# Altium schematic symbol library AliPadash.SchLib: 1186 symbols (part 3 of 6) (continued)
## LM7908 (continued)
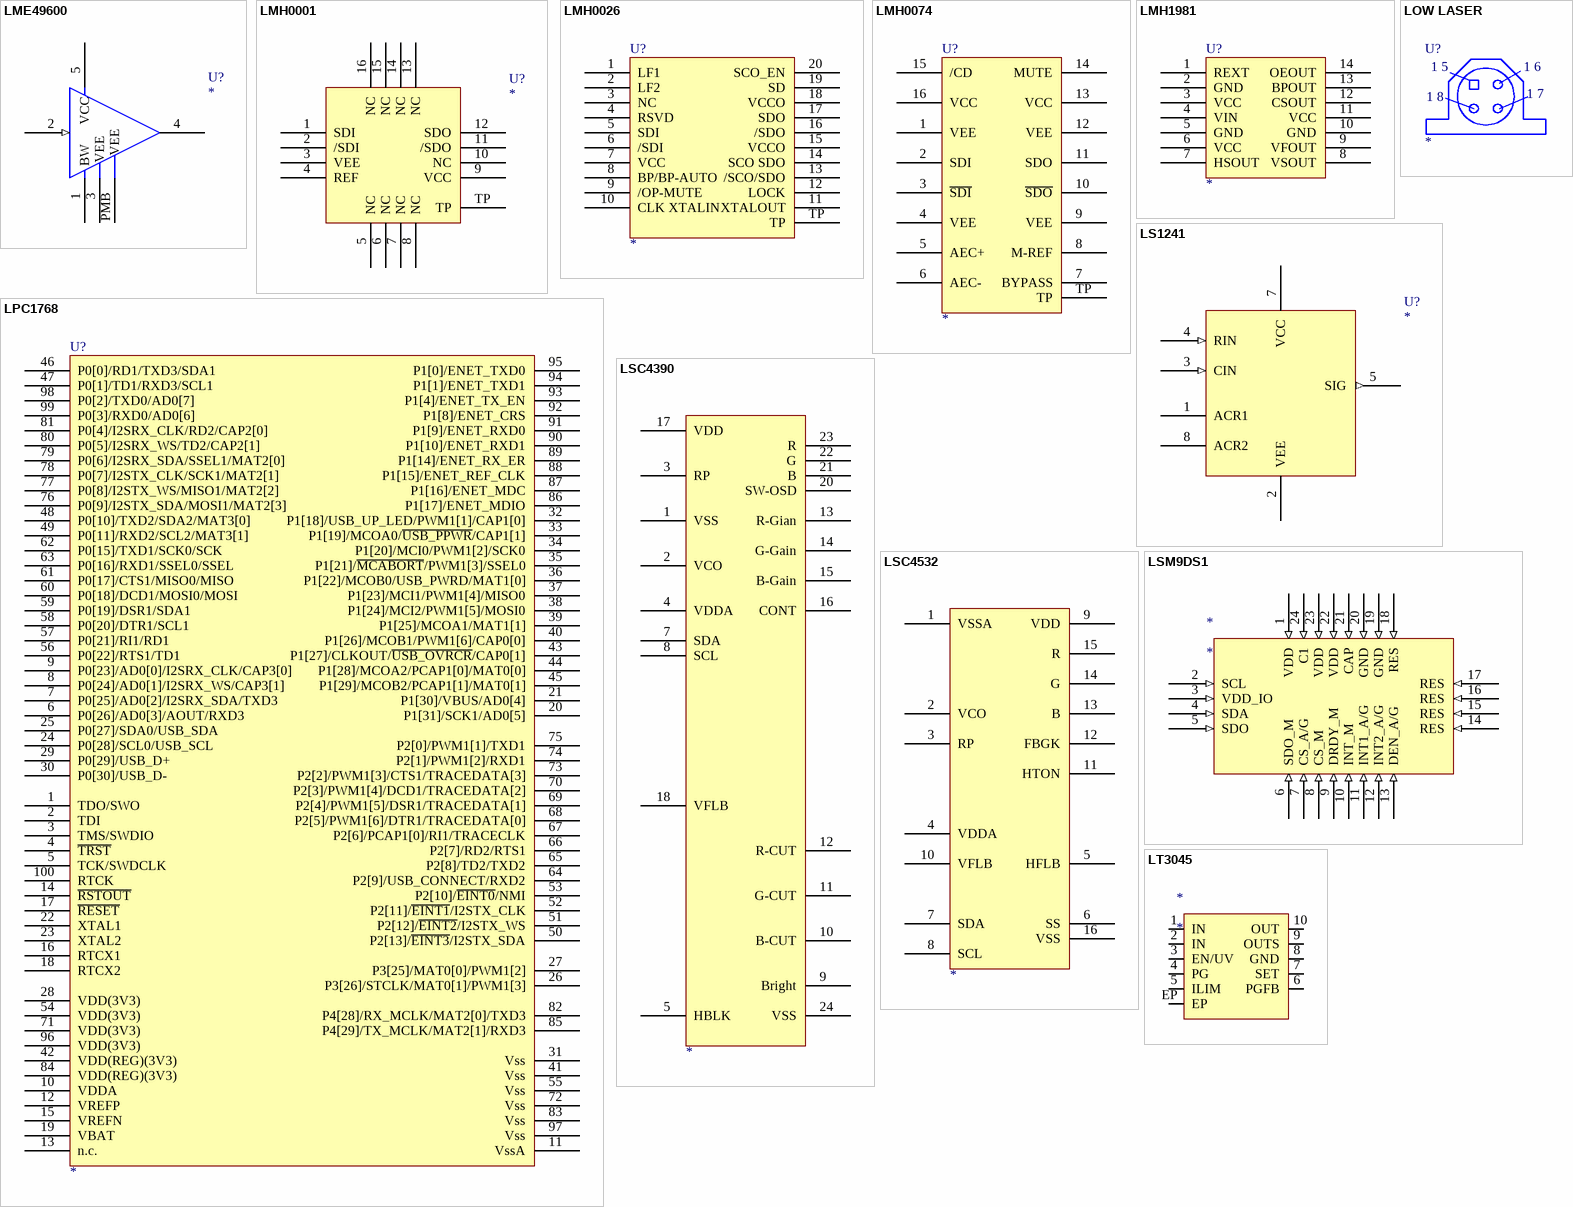
[diagram p39: symbols LME49600 to LT3045]

## LME49600
designator U?
footprint TS5B
pins: 1  BW, 2 (in), 3   VEE, 4, 5 VCC, PMB     VEE

## LMH0001
designator U?
footprint QFN16
pins: 1 SDI, 2 /SDI, 3 VEE, 4 REF, 5 NC, 6 NC, 7 NC, 8 NC, 9 VCC, 10 NC, 11 /SDO, 12 SDO, 13 NC, 14 NC, 15 NC, 16 NC, TP

## LMH0026
designator U?
footprint TSSOP20
pins: 1 LF1, 2 LF2, 3 NC, 4 RSVD, 5 SDI, 6 /SDI, 7 VCC, 8 BP/BP-AUTO, 9 /OP-MUTE, 10 CLK XTALIN, 11 XTALOUT, 12 LOCK, 13 /SCO/SDO, 14 SCO SDO, 15 VCCO, 16 /SDO, 17 SDO, 18 VCCO, 19 SD, 20 SCO_EN, TP

## LMH0074
designator U?
footprint QFN16
pins: 1 VEE, 2 SDI, 3 ~{SDI}, 4 VEE, 5 AEC+, 6 AEC-, 7 BYPASS, 8 M-REF, 9 VEE, 10 ~{SDO}, 11 SDO, 12 VEE, 13 VCC, 14 MUTE, 15 /CD, 16 VCC, TP

## LMH1981
designator U?
footprint TSS-14
pins: 1 REXT, 2 GND, 3 VCC, 4 VIN, 5 GND, 6 VCC, 7 HSOUT, 8 VSOUT, 9 VFOUT, 10 GND, 11 VCC, 12 CSOUT, 13 BPOUT, 14 OEOUT

## LOW LASER
designator U?
text: 1 5; 1 6; 1 8; 1 7

## LPC1768
designator U?
footprint LQFP100
pins: 1 TDO/SWO, 2 TDI, 3 TMS/SWDIO, 4 ~{TRST}, 5 TCK/SWDCLK, 6 P0[26]/AD0[3]/AOUT/RXD3, 7 P0[25]/AD0[2]/I2SRX_SDA/TXD3, 8 P0[24]/AD0[1]/I2SRX_WS/CAP3[1], 9 P0[23]/AD0[0]/I2SRX_CLK/CAP3[0], 10 VDDA, 11 VssA, 12 VREFP, 13 n.c., 14 ~{RSTOUT}, 15 VREFN, 16 RTCX1, 17 ~{RESET}, 18 RTCX2, 19 VBAT, 20 P1[31]/SCK1/AD0[5], 21 P1[30]/VBUS/AD0[4], 22 XTAL1, 23 XTAL2, 24 P0[28]/SCL0/USB_SCL, 25 P0[27]/SDA0/USB_SDA, 26 P3[26]/STCLK/MAT0[1]/PWM1[3], 27 P3[25]/MAT0[0]/PWM1[2], 28 VDD(3V3), 29 P0[29]/USB_D+, 30 P0[30]/USB_D-, 31 Vss, 32 P1[18]/USB_UP_LED/PWM1[1]/CAP1[0], 33 P1[19]/MCOA0/~{USB_PPWR}/CAP1[1], 34 P1[20]/MCI0/PWM1[2]/SCK0, 35 P1[21]/~{MCABORT}/PWM1[3]/SSEL0, 36 P1[22]/MCOB0/USB_PWRD/MAT1[0], 37 P1[23]/MCI1/PWM1[4]/MISO0, 38 P1[24]/MCI2/PWM1[5]/MOSI0, 39 P1[25]/MCOA1/MAT1[1], 40 P1[26]/MCOB1/PWM1[6]/CAP0[0], 41 Vss, 42 VDD(REG)(3V3), 43 P1[27]/CLKOUT/~{USB_OVRCR}/CAP0[1], 44 P1[28]/MCOA2/PCAP1[0]/MAT0[0], 45 P1[29]/MCOB2/PCAP1[1]/MAT0[1], 46 P0[0]/RD1/TXD3/SDA1, 47 P0[1]/TD1/RXD3/SCL1, 48 P0[10]/TXD2/SDA2/MAT3[0], 49 P0[11]/RXD2/SCL2/MAT3[1], 50 P2[13]/~{EINT3}/I2STX_SDA, 51 P2[12]/~{EINT2}/I2STX_WS, 52 P2[11]/~{EINT1}/I2STX_CLK, 53 P2[10]/~{EINT0}/NMI, 54 VDD(3V3), 55 Vss, 56 P0[22]/RTS1/TD1, 57 P0[21]/RI1/RD1, 58 P0[20]/DTR1/SCL1, 59 P0[19]/DSR1/SDA1, 60 P0[18]/DCD1/MOSI0/MOSI, 61 P0[17]/CTS1/MISO0/MISO, 62 P0[15]/TXD1/SCK0/SCK, 63 P0[16]/RXD1/SSEL0/SSEL, 64 P2[9]/USB_CONNECT/RXD2, 65 P2[8]/TD2/TXD2, 66 P2[7]/RD2/RTS1, 67 P2[6]/PCAP1[0]/RI1/TRACECLK, 68 P2[5]/PWM1[6]/DTR1/TRACEDATA[0], 69 P2[4]/PWM1[5]/DSR1/TRACEDATA[1], 70 P2[3]/PWM1[4]/DCD1/TRACEDATA[2], 71 VDD(3V3), 72 Vss, 73 P2[2]/PWM1[3]/CTS1/TRACEDATA[3], 74 P2[1]/PWM1[2]/RXD1, 75 P2[0]/PWM1[1]/TXD1, 76 P0[9]/I2STX_SDA/MOSI1/MAT2[3], 77 P0[8]/I2STX_WS/MISO1/MAT2[2], 78 P0[7]/I2STX_CLK/SCK1/MAT2[1], 79 P0[6]/I2SRX_SDA/SSEL1/MAT2[0], 80 P0[5]/I2SRX_WS/TD2/CAP2[1], 81 P0[4]/I2SRX_CLK/RD2/CAP2[0], 82 P4[28]/RX_MCLK/MAT2[0]/TXD3, 83 Vss, 84 VDD(REG)(3V3), 85 P4[29]/TX_MCLK/MAT2[1]/RXD3, 86 P1[17]/ENET_MDIO, 87 P1[16]/ENET_MDC, 88 P1[15]/ENET_REF_CLK, 89 P1[14]/ENET_RX_ER, 90 P1[10]/ENET_RXD1, 91 P1[9]/ENET_RXD0, 92 P1[8]/ENET_CRS, 93 P1[4]/ENET_TX_EN, 94 P1[1]/ENET_TXD1, 95 P1[0]/ENET_TXD0, 96 VDD(3V3), 97 Vss, 98 P0[2]/TXD0/AD0[7], 99 P0[3]/RXD0/AD0[6], 100 RTCK

## LS1241
designator U?
pins: 1 ACR1, 2 VEE, 3 CIN (in), 4 RIN (in), 5 SIG (out), 7 VCC, 8 ACR2

## LSC4390
designator ?
pins: 1 VSS, 2 VCO, 3 RP, 4 VDDA, 5 HBLK, 7 SDA, 8 SCL, 9 Bright, 10 B-CUT, 11 G-CUT, 12 R-CUT, 13 R-Gian, 14 G-Gain, 15 B-Gain, 16 CONT, 17 VDD, 18 VFLB, 20 SW-OSD, 21 B, 22 G, 23 R, 24 VSS

## LSC4532
designator ?
pins: 1 VSSA, 2 VCO, 3 RP, 4 VDDA, 5 HFLB, 6 SS, 7 SDA, 8 SCL, 9 VDD, 10 VFLB, 11 HTON, 12 FBGK, 13 B, 14 G, 15 R, 16 VSS

## LSM9DS1
designator *
pins: 1 VDD (in), 2 SCL (in), 3 VDD_IO (in), 4 SDA (in), 5 SDO (in), 6 SDO_M (in), 7 CS_A/G (in), 8 CS_M (in), 9 DRDY_M (in), 10 INT_M (in), 11 INT1_A/G (in), 12 INT2_A/G (in), 13 DEN_A/G (in), 14 RES (in), 15 RES (in), 16 RES (in), 17 RES (in), 18 RES (in), 19 GND (in), 20 GND (in), 21 CAP (in), 22 VDD (in), 23 VDD (in), 24 C1 (in)

## LT3045
designator *
footprint DDFN10
pins: 1 IN, 2 IN, 3 EN/UV, 4 PG, 5 ILIM, 6 PGFB, 7 SET, 8 GND, 9 OUTS, 10 OUT, EP

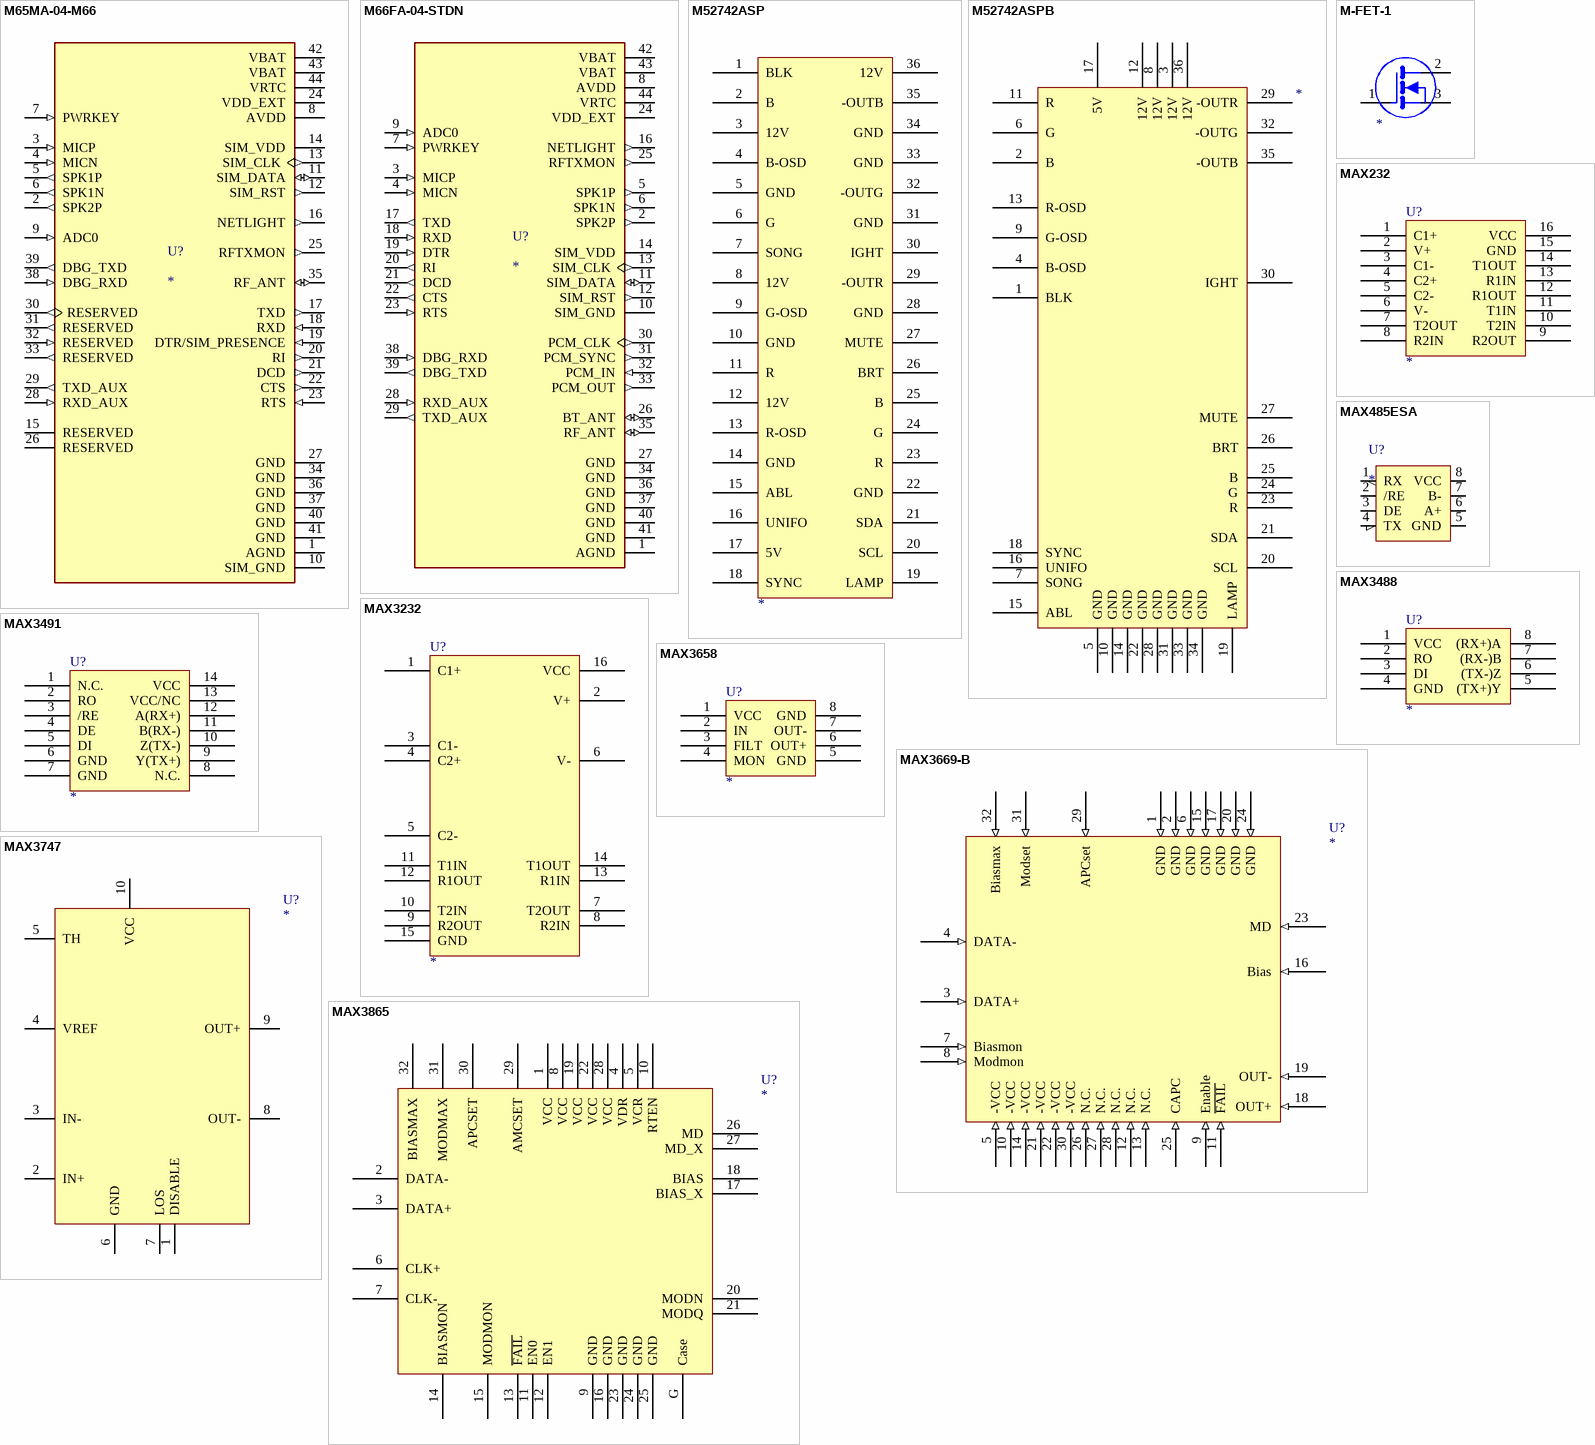
[diagram p40: symbols M65MA-04-M66 to MAX3865]

## M65MA-04-M66
designator U?
Cellular GSM, GPRS Transceiver Module 850MHz, 900MHz, 1.8GHz, 1.9GHz Antenna Not Included Surface Mount; MP: M65MA-04-M66; MF: Quectel; Price: None; SnapEDA_Link: https://www.snapeda.com/parts/M65MA-04-M66/Quectel/view-part/?ref=snap; Check_prices: https://www.snapeda.com/parts/M65MA-04-M66/Quectel/view-part/?ref=eda; Availability: Not in stock; Value: *; Package: None
footprint XCVR_M65MA-04-M66
pins: 1 AGND (power), 2 SPK2P (out), 3 MICP (in), 4 MICN (in), 5 SPK1P (out), 6 SPK1N (out), 7 PWRKEY (in), 8 AVDD (power), 9 ADC0 (in), 10 SIM_GND (power), 11 SIM_DATA (io), 12 SIM_RST (out), 13 SIM_CLK (out), 14 SIM_VDD (power), 15 RESERVED, 16 NETLIGHT (out), 17 TXD (out), 18 RXD (in), 19 DTR/SIM_PRESENCE (in), 20 RI (out), 21 DCD (out), 22 CTS (out), 23 RTS (in), 24 VDD_EXT (power), 25 RFTXMON (out), 26 RESERVED, 27 GND (power), 28 RXD_AUX (in), 29 TXD_AUX (out), 30 RESERVED (out), 31 RESERVED (out), 32 RESERVED (in), 33 RESERVED (out), 34 GND (power), 35 RF_ANT (io), 36 GND (power), 37 GND (power), 38 DBG_RXD (in), 39 DBG_TXD (out), 40 GND (power), 41 GND (power), 42 VBAT (power), 43 VBAT (power), 44 VRTC (power)

## M66FA-04-STDN
designator U?
Bluetooth, Cellular Bluetooth v3.0, GSM, GPRS Transceiver Module 850MHz, 900MHz, 1.8GHz, 1.9GHz Antenna Not Included Surface Mount; MF: Quectel; MP: M66FA04STDN; Value: *; Purchase-URL: https://pricing.snapeda.com/search/part/M66FA04STDN/?ref=eda; Price: None; Package: SMD-52 Quectel; Availability: In Stock; SnapEDA_Link: https://www.snapeda.com/parts/M66FA04STDN/Quectel/view-part/?ref=snap; Check_prices: https://www.snapeda.com/parts/M66FA04STDN/Quectel/view-part/?ref=eda
footprint XCVR_M66FA-04-STDN
pins: 1 AGND (power), 2 SPK2P (out), 3 MICP (in), 4 MICN (in), 5 SPK1P (out), 6 SPK1N (out), 7 PWRKEY (in), 8 AVDD (power), 9 ADC0 (in), 10 SIM_GND (power), 11 SIM_DATA (io), 12 SIM_RST (out), 13 SIM_CLK (out), 14 SIM_VDD (power), 16 NETLIGHT (out), 17 TXD (out), 18 RXD (in), 19 DTR (in), 20 RI (out), 21 DCD (out), 22 CTS (out), 23 RTS (in), 24 VDD_EXT (power), 25 RFTXMON (out), 26 BT_ANT (io), 27 GND (power), 28 RXD_AUX (in), 29 TXD_AUX (out), 30 PCM_CLK (out), 31 PCM_SYNC (out), 32 PCM_IN (in), 33 PCM_OUT (out), 34 GND (power), 35 RF_ANT (io), 36 GND (power), 37 GND (power), 38 DBG_RXD (in), 39 DBG_TXD (out), 40 GND (power), 41 GND (power), 42 VBAT (power), 43 VBAT (power), 44 VRTC (power)

## M52742ASP
designator ?
pins: 1 BLK, 2 B, 3 12V, 4 B-OSD, 5 GND, 6 G, 7 SONG, 8 12V, 9 G-OSD, 10 GND, 11 R, 12 12V, 13 R-OSD, 14 GND, 15 ABL, 16 UNIFO, 17 5V, 18 SYNC, 19 LAMP, 20 SCL, 21 SDA, 22 GND, 23 R, 24 G, 25 B, 26 BRT, 27 MUTE, 28 GND, 29 -OUTR, 30 IGHT, 31 GND, 32 -OUTG, 33 GND, 34 GND, 35 -OUTB, 36 12V

## M52742ASPB
designator ?
pins: 1 BLK, 2 B, 3 12V, 4 B-OSD, 5 GND, 6 G, 7 SONG, 8 12V, 9 G-OSD, 10 GND, 11 R, 12 12V, 13 R-OSD, 14 GND, 15 ABL, 16 UNIFO, 17 5V, 18 SYNC, 19 LAMP, 20 SCL, 21 SDA, 22 GND, 23 R, 24 G, 25 B, 26 BRT, 27 MUTE, 28 GND, 29 -OUTR, 30 IGHT, 31 GND, 32 -OUTG, 33 GND, 34 GND, 35 -OUTB, 36 12V

## M-FET-1
designator ?
pins: 1, 2, 3

## MAX232
designator U?
footprint SOL-16
pins: 1 C1+, 2 V+, 3 C1-, 4 C2+, 5 C2-, 6 V-, 7 T2OUT, 8 R2IN, 9 R2OUT, 10 T2IN, 11 T1IN, 12 R1OUT, 13 R1IN, 14 T1OUT, 15 GND, 16 VCC

## MAX485ESA
designator U?
MFAC: SN65176BDR; JLC: C31302
footprint SO-8
pins: 1 RX, 2 /RE, 3 DE, 4 TX, 5 GND, 6 A+, 7 B-, 8 VCC

## MAX3232
designator U?
footprint SOP16
pins: 1 C1+, 2 V+, 3 C1-, 4 C2+, 5 C2-, 6 V-, 7 T2OUT, 8 R2IN, 9 R2OUT, 10 T2IN, 11 T1IN, 12 R1OUT, 13 R1IN, 14 T1OUT, 15 GND, 16 VCC

## MAX3488
designator U?
footprint SO-8
pins: 1 VCC, 2 RO, 3 DI, 4 GND, 5 (TX+)Y, 6 (TX-)Z, 7 (RX-)B, 8 (RX+)A

## MAX3491
designator U?
footprint SO-14
pins: 1 N.C., 2 RO, 3 /RE, 4 DE, 5 DI, 6 GND, 7 GND, 8 N.C., 9 Y(TX+), 10 Z(TX-), 11 B(RX-), 12 A(RX+), 13 VCC/NC, 14 VCC

## MAX3658
designator U?
footprint T833
pins: 1 VCC, 2 IN, 3 FILT, 4 MON, 5 GND, 6 OUT+, 7 OUT-, 8 GND

## MAX3669-B
designator U?
footprint MAX3669
pins: 1 GND (in), 2 GND (in), 3 DATA+ (in), 4 DATA- (in), 5 -VCC (in), 6 GND (in), 7 Biasmon (in), 8 Modmon (in), 9 Enable (in), 10 -VCC (in), 11 ~{FAIL} (in), 12 N.C. (in), 13 N.C. (in), 14 -VCC (in), 15 GND (in), 16 Bias (in), 17 GND (in), 18 OUT+ (in), 19 OUT- (in), 20 GND (in), 21 -VCC (in), 22 -VCC (in), 23 MD (in), 24 GND (in), 25 CAPC (in), 26 N.C. (in), 27 N.C. (in), 28 N.C. (in), 29 APCset (in), 30 -VCC (in), 31 Modset (in), 32 Biasmax (in)

## MAX3747
designator U?
footprint 10UMAX
pins: 1 DISABLE, 2 IN+, 3 IN-, 4 VREF, 5 TH, 6 GND, 7 LOS, 8 OUT-, 9 OUT+, 10 VCC

## MAX3865
designator U?
footprint ADN8830 - A
pins: 1 VCC, 2 DATA-, 3 DATA+, 4 VDR, 5 VCR, 6 CLK+, 7 CLK-, 8 VCC, 9 GND, 10 RTEN, 11 EN0, 12 EN1, 13 ~{FAIL}, 14 BIASMON, 15 MODMON, 16 GND, 17 BIAS_X, 18 BIAS, 19 VCC, 20 MODN, 21 MODQ, 22 VCC, 23 GND, 24 GND, 25 GND, 26 MD, 27 MD_X, 28 VCC, 29 AMCSET, 30 APCSET, 31 MODMAX, 32 BIASMAX, G Case

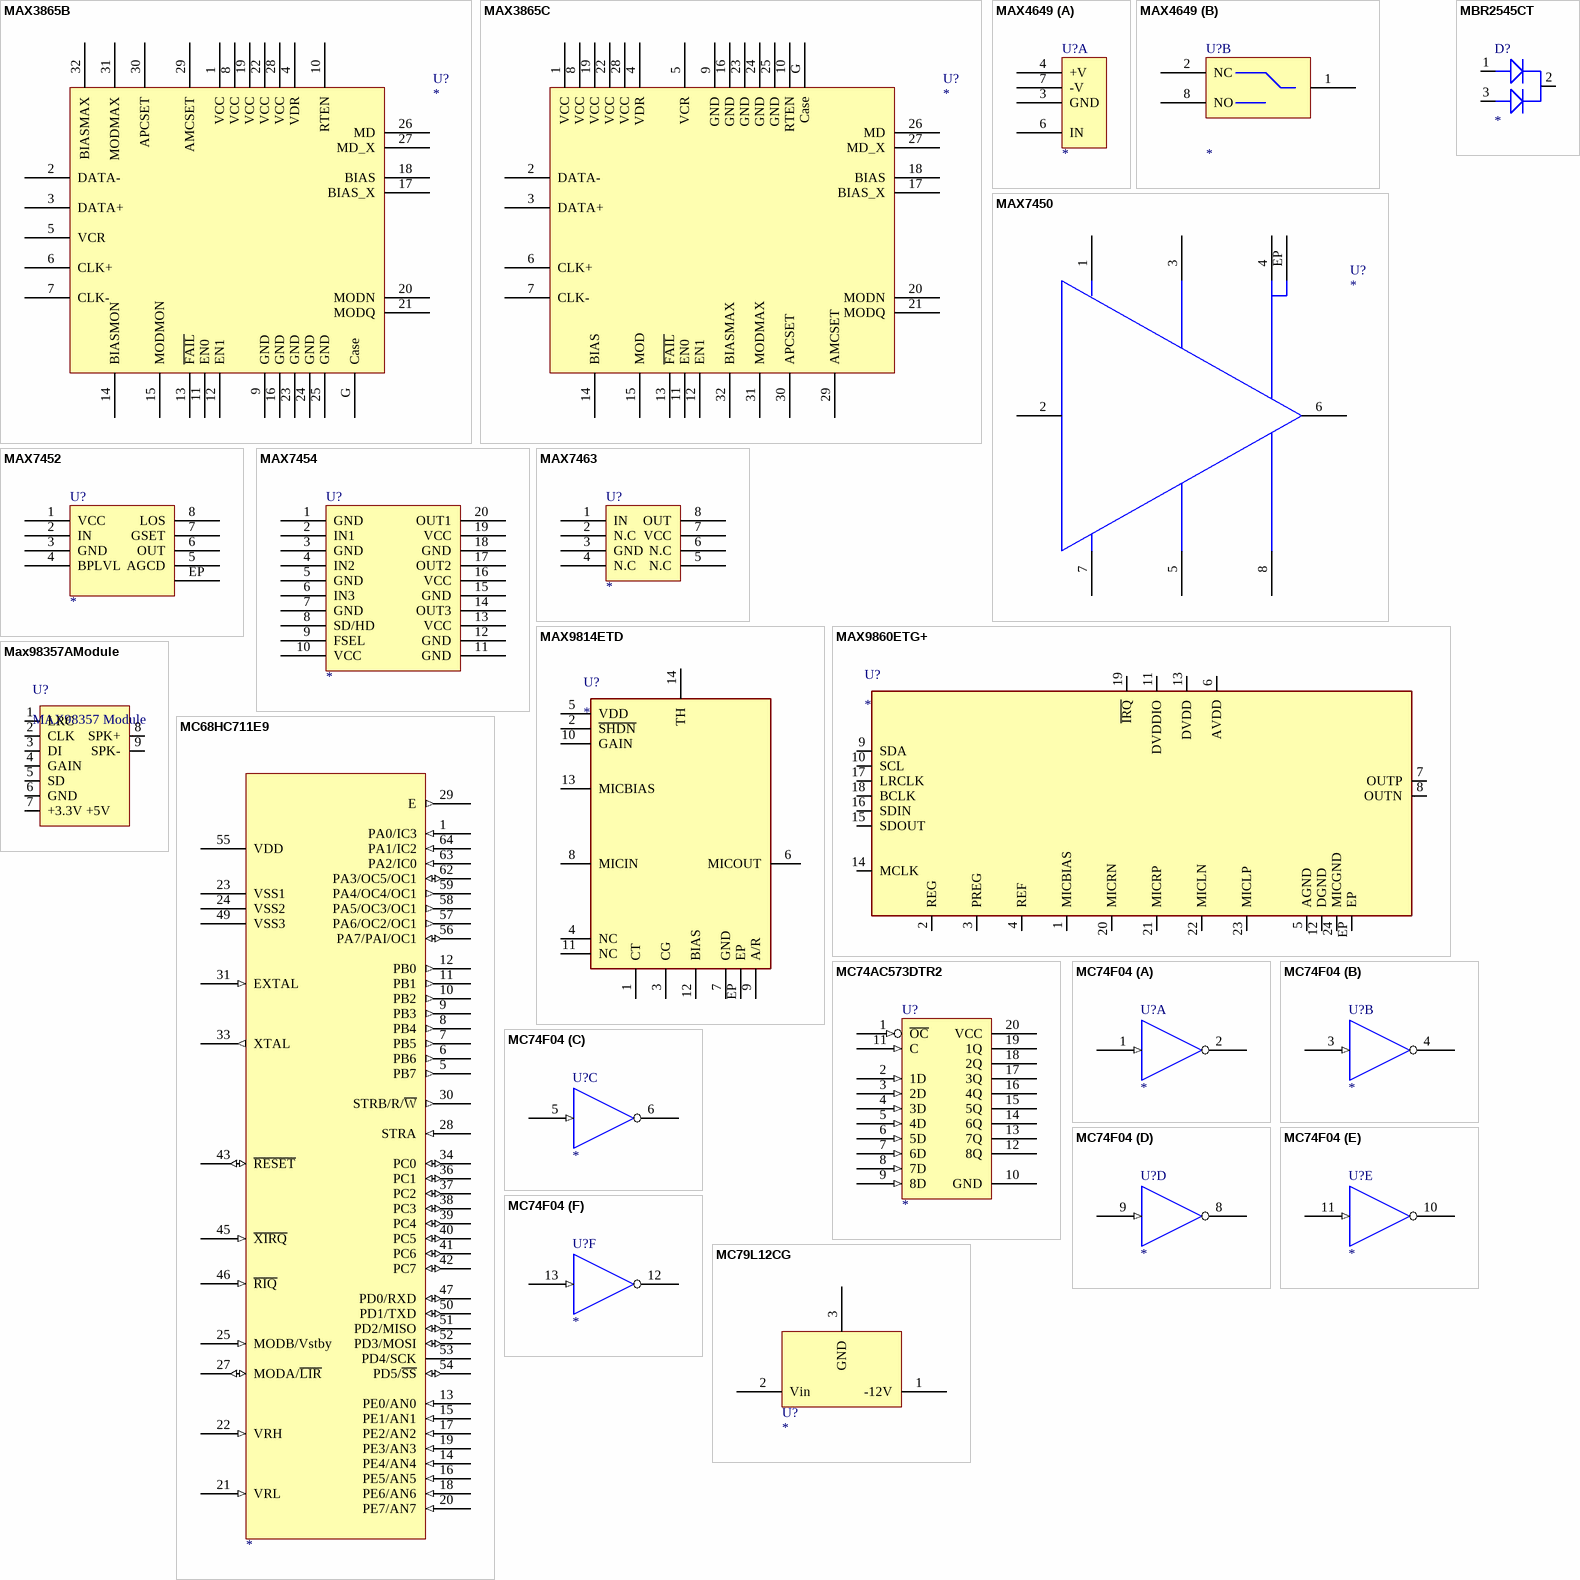
[diagram p41: symbols MAX3865B to MC79L12CG]

## MAX3865B
designator U?
footprint ADN8830 - A
pins: 1 VCC, 2 DATA-, 3 DATA+, 4 VDR, 5 VCR, 6 CLK+, 7 CLK-, 8 VCC, 9 GND, 10 RTEN, 11 EN0, 12 EN1, 13 ~{FAIL}, 14 BIASMON, 15 MODMON, 16 GND, 17 BIAS_X, 18 BIAS, 19 VCC, 20 MODN, 21 MODQ, 22 VCC, 23 GND, 24 GND, 25 GND, 26 MD, 27 MD_X, 28 VCC, 29 AMCSET, 30 APCSET, 31 MODMAX, 32 BIASMAX, G Case

## MAX3865C
designator U?
footprint ADN8830 - A
pins: 1 VCC, 2 DATA-, 3 DATA+, 4 VDR, 5 VCR, 6 CLK+, 7 CLK-, 8 VCC, 9 GND, 10 RTEN, 11 EN0, 12 EN1, 13 ~{FAIL}, 14 BIAS, 15 MOD, 16 GND, 17 BIAS_X, 18 BIAS, 19 VCC, 20 MODN, 21 MODQ, 22 VCC, 23 GND, 24 GND, 25 GND, 26 MD, 27 MD_X, 28 VCC, 29 AMCSET, 30 APCSET, 31 MODMAX, 32 BIASMAX, G Case

## MAX4649
designator U?
part A pins: 3 GND, 4 +V, 6 IN, 7 -V
part B pins: 1 COM, 2 NC, 8 NO

## MAX7450
designator U?
footprint SO-8-EP
pins: 1, 2, 3, 4, 5, 6, 7, 8, EP

## MAX7452
designator U?
footprint SO-8-EP
pins: 1 VCC, 2 IN, 3 GND, 4 BPLVL, 5 AGCD, 6 OUT, 7 GSET, 8 LOS, EP

## MAX7454
designator U?
footprint TSSOP20
pins: 1 GND, 2 IN1, 3 GND, 4 IN2, 5 GND, 6 IN3, 7 GND, 8 SD/HD, 9 FSEL, 10 VCC, 11 GND, 12 GND, 13 VCC, 14 OUT3, 15 GND, 16 VCC, 17 OUT2, 18 GND, 19 VCC, 20 OUT1

## MAX7463
designator U?
footprint SO-8
pins: 1 IN, 2 N.C, 3 GND, 4 N.C, 5 N.C, 6 N.C, 7 VCC, 8 OUT

## MAX9814ETD
designator U?
MFAC: MAX9814ETD+T; jlc: C41714
footprint SON40P300X300X80-15N
pins: 1 CT, 2 ~{SHDN}, 3 CG, 4 NC, 5 VDD, 6 MICOUT, 7 GND, 8 MICIN, 9 A/R, 10 GAIN, 11 NC, 12 BIAS, 13 MICBIAS, 14 TH, EP

## MAX9860ETG+
designator U?
footprint QFN24
pins: 1 MICBIAS, 2 REG, 3 PREG, 4 REF, 5 AGND, 6 AVDD, 7 OUTP, 8 OUTN, 9 SDA, 10 SCL, 11 DVDDIO, 12 DGND, 13 DVDD, 14 MCLK, 15 SDOUT, 16 SDIN, 17 LRCLK, 18 BCLK, 19 ~{IRQ}, 20 MICRN, 21 MICRP, 22 MICLN, 23 MICLP, 24 MICGND, EP

## Max98357AModule
designator U?, comment MAX98357 Module
footprint MAX98357 Module
pins: 1 LRC, 2 CLK, 3 DI, 4 GAIN, 5 SD, 6 GND, 7 +3.3V +5V, 8 SPK+, 9 SPK-

## MBR2545CT
designator D?
pins: 1 A1, 2 C, 3 A2